# Altium footprint library lib_protel_HC_BOINA.PCBLIB: 726 footprints (part 27 of 46)
Each footprint in its own frame and in the unit in brackets; x right, y up, seen from the top. Pads: shape width x height; smd on the part's side, far side on the other; paste and mask are expansions set on the pad; w line width, h text height; cw(c..) or ccw(c..) is an arc to the next point about the centre after c.
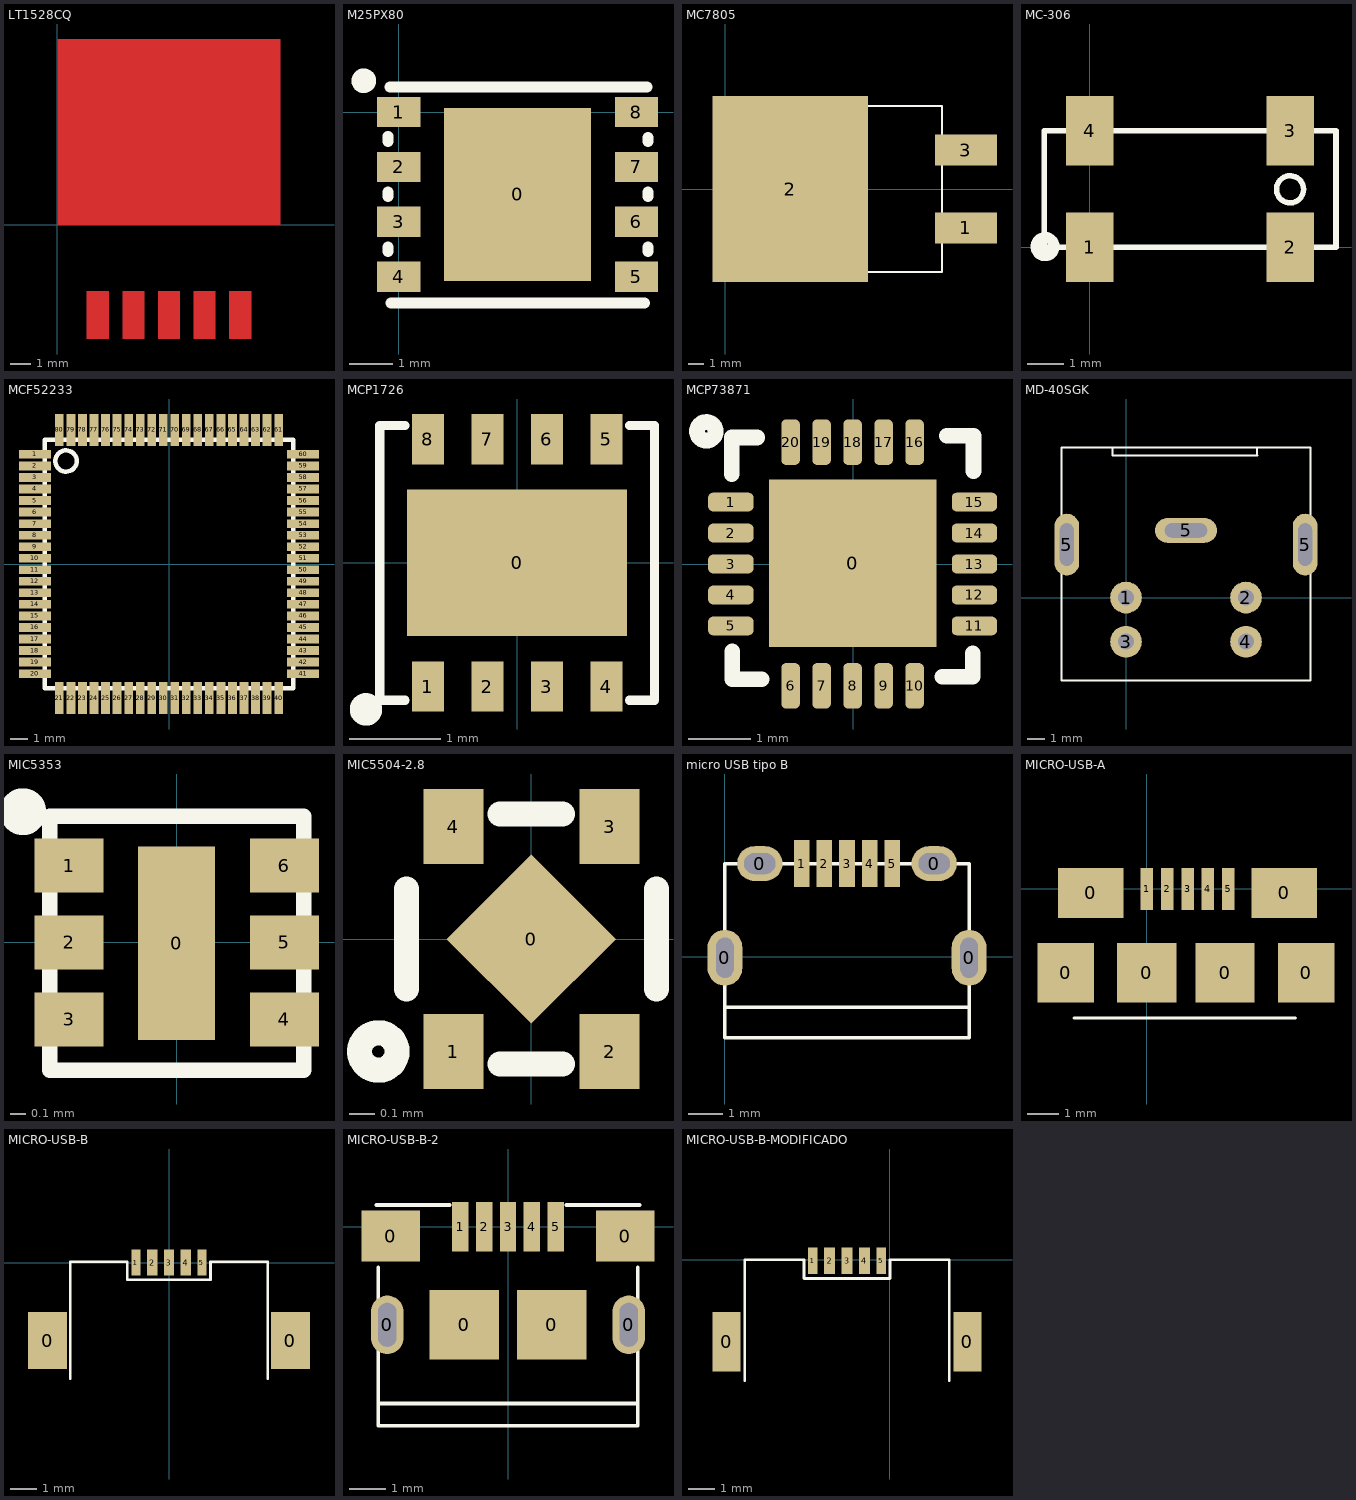
[diagram p26: the footprints below, top view; thin cyan lines are the x and y axes]

## LT1528CQ [mm] "LT1528CQ"
height 4.5
Top Layer:
  rectangle: 0,0 10.668,8.89
  rectangle: 4.801,-5.461 5.867,-3.175
  rectangle: 6.502,-5.461 7.569,-3.175
  rectangle: 3.099,-5.461 4.166,-3.175
  rectangle: 1.397,-5.461 2.464,-3.175
  rectangle: 8.204,-5.461 9.271,-3.175

## M25PX80 [mm] "Memoria Flash"
height 0.65
pads (9):
  rect 3.4x4 smd: 0(2.75,-1.905)
  rect 1x0.7 smd: 1(0,0) 2(0,-1.27) 3(0,-2.54) 4(0,-3.81) 5(5.5,-3.81) 6(5.5,-2.54) 7(5.5,-1.27) 8(5.5,0)
Top Overlay:
  circle w0.3: c-0.81,0.725 r0.135
  lines w0.254: -0.254,-3.226 -0.254,-3.124 ; -0.254,-1.956 -0.254,-1.854 ; -0.254,-0.686 -0.254,-0.559 ; -0.203,0.584 5.74,0.584 ; -0.178,-4.42 5.69,-4.42 ; 5.766,-3.226 5.766,-3.124 ; 5.766,-1.956 5.766,-1.854 ; 5.766,-0.686 5.766,-0.584
3D body "User Library-WSON-8.STEP": height 0.79, standoff -0.01, extent -0.248,-4.374 5.752,0.626

## MC7805 [mm] "REGULADOR MC7805"
pads (3):
  rect 4x2 smd: 1(15.5,-2.504) 3(15.5,2.504)
  rect 10x12 smd: 2(4.191,0)
Top Overlay:
  lines w0.127: 0,-5.334 13.97,-5.334 13.97,5.334 0,5.334 0,-5.334

## MC-306 [mm] "CRYSTAL 32.768KHZ"
height 2.54
pads (4):
  rect 1.3x1.9 smd: 1(0,0) 2(5.5,0) 3(5.5,3.2) 4(0,3.2)
Top Overlay:
  circle w0.15: c5.5,1.59 r0.371
  circle w0.3: c-1.22,0.02 r0.25
  lines w0.152: -1.24,0 -1.24,3.2 6.76,3.2 6.76,0 -1.24,0

## MCF52233 [mm]
height 1.6
pads (80):
  rect 1.8x0.49 smd: 1(-7.55,6.175) 2(-7.55,5.525) 3(-7.55,4.875) 4(-7.55,4.225) 5(-7.55,3.575) 6(-7.55,2.925) 7(-7.55,2.275) 8(-7.55,1.625) 9(-7.55,0.975) 10(-7.55,0.325) 11(-7.55,-0.325) 12(-7.55,-0.975) 13(-7.55,-1.625) 14(-7.55,-2.275) 15(-7.55,-2.925) 16(-7.55,-3.575) 17(-7.55,-4.225) 18(-7.55,-4.875) 19(-7.55,-5.525) 20(-7.55,-6.175) 41(7.55,-6.175) 42(7.55,-5.525) 43(7.55,-4.875) 44(7.55,-4.225) 45(7.55,-3.575) 46(7.55,-2.925) 47(7.55,-2.275) 48(7.55,-1.625) 49(7.55,-0.975) 50(7.55,-0.325) 51(7.55,0.325) 52(7.55,0.975) 53(7.55,1.625) 54(7.55,2.275) 55(7.55,2.925) 56(7.55,3.575) 57(7.55,4.225) 58(7.55,4.875) 59(7.55,5.525) 60(7.55,6.175)
  rect 0.49x1.8 smd: 21(-6.175,-7.55) 22(-5.525,-7.55) 23(-4.875,-7.55) 24(-4.225,-7.55) 25(-3.575,-7.55) 26(-2.925,-7.55) 27(-2.275,-7.55) 28(-1.625,-7.55) 29(-0.975,-7.55) 30(-0.325,-7.55) 31(0.325,-7.55) 32(0.975,-7.55) 33(1.625,-7.55) 34(2.275,-7.55) 35(2.925,-7.55) 36(3.575,-7.55) 37(4.225,-7.55) 38(4.875,-7.55) 39(5.525,-7.55) 40(6.175,-7.55) 61(6.175,7.55) 62(5.525,7.55) 63(4.875,7.55) 64(4.225,7.55) 65(3.575,7.55) 66(2.925,7.55) 67(2.275,7.55) 68(1.625,7.55) 69(0.975,7.55) 70(0.325,7.55) 71(-0.325,7.55) 72(-0.975,7.55) 73(-1.625,7.55) 74(-2.275,7.55) 75(-2.925,7.55) 76(-3.575,7.55) 77(-4.225,7.55) 78(-4.875,7.55) 79(-5.525,7.55) 80(-6.175,7.55)
Top Overlay:
  circle w0.254: c-5.8,5.8 r0.6
  lines w0.254: -7,-7 7,-7 7,7 -7,7 -7,-7

## MCP1726 [mm] "REG MCP1726 ADJ"
height 0.9
pads (9):
  rect 2.4x1.6 smd mask+0.05: 0(0,0)
  rect 0.35x0.55 smd mask+0.05: 1(-0.975,-1.35) 2(-0.325,-1.35) 3(0.325,-1.35) 4(0.975,-1.35) 6(0.325,1.35) 7(-0.325,1.35) 8(-0.975,1.35)
  rect 0.35x0.55 smd paste+0 mask+0.05: 5(0.975,1.35)
Top Overlay:
  circle w0.254: c-1.65,-1.6 r0.05
  lines w0.1: -1.225,-1.5 -1.5,-1.5 -1.5,1.5 -1.225,1.5 ; 1.225,-1.5 1.5,-1.5 1.5,1.5 1.225,1.5

## MCP73871 [mm] "Battery charger"
height 0.9
pads (21):
  rect 2.7x2.7 smd paste+0 mask+0: 0(-0.01,0.01)
  rrect50% 0.73x0.3 smd mask+0.05: 1(-1.975,1) 2(-1.975,0.5) 3(-1.975,0) 4(-1.975,-0.5) 5(-1.975,-1) 11(1.955,-1) 12(1.955,-0.5) 13(1.955,0) 14(1.955,0.5) 15(1.955,1)
  rrect50% 0.3x0.73 smd mask+0.05: 6(-1.01,-1.965) 7(-0.51,-1.965) 8(-0.01,-1.965) 9(0.49,-1.965) 10(0.99,-1.965) 16(0.99,1.965) 17(0.49,1.965) 18(-0.01,1.965) 19(-0.51,1.965) 20(-1.01,1.965)
Top Overlay:
  circle w0.254: c-2.37,2.14 r0.15
  lines w0.254: -1.96,1.45 -1.96,2.04 -1.55,2.04 ; -1.95,-1.41 -1.95,-1.86 -1.48,-1.86 ; 1.44,-1.82 1.93,-1.82 1.93,-1.44 ; 1.51,2.07 1.94,2.07 1.94,1.5
3D body "QFN20_4x4x0_8.STEP": height 0.78, standoff -0.02, extent -2.02,-2 2,2.02

## MD-40SGK [mm] "CONECTOR S-VIDEO"
height 13
pads (7):
  round 1.8 hole 0.9: 1(0,0) 2(6.8,0) 3(0,-2.5) 4(6.8,-2.5)
  oval 1.4x3.5 hole 0.8 slot 2.4 at 90 deg: 5(-3.35,3) 5(10.15,3)
  oval 3.5x1.4 hole 0.8 slot 2.4 at 0 deg: 5(3.4,3.8)
Top Overlay:
  lines w0.127: -0.76,8.5 -0.76,8.05 7.44,8.05 7.43,8.06 7.43,8.49 ; -3.65,-4.7 10.45,-4.7 10.45,8.5 -3.65,8.5 -3.65,-4.7

## MIC5353 [mm] "Regulador LDO Vout=3V"
height 0.6
pads (7):
  rect 0.5x1.26 smd mask+0: 0(0,-0.005)
  rect 0.45x0.35 smd mask+0.05: 1(-0.7,0.5) 2(-0.7,0) 3(-0.7,-0.5) 4(0.7,-0.5) 5(0.7,0) 6(0.7,0.5)
Top Overlay:
  circle w0.254: c-1,0.85 r0.025
  lines w0.1: -0.825,-0.83 -0.825,0.82 0.825,0.82 0.825,-0.83 -0.825,-0.83
3D body "User Library-Thin MLF.step": height 0.55, standoff 0, extent -0.81,-0.8 0.81,0.8

## MIC5504-2.8 [mm] "TDFN1010"
height 0.55
pads (5):
  rect 0.48x0.48 smd rot 45 mask+0.05: 0(0,0)
  rect 0.24x0.3 smd mask+0.05: 1(-0.312,-0.45) 2(0.312,-0.45) 3(0.312,0.45) 4(-0.312,0.45)
Top Overlay:
  circle w0.1: c-0.613,-0.45 r0.075
  lines w0.1: -0.5,-0.2 -0.5,0.2 ; -0.125,-0.5 0.125,-0.5 ; -0.125,0.5 0.125,0.5 ; 0.5,-0.2 0.5,0.2
3D body: height 0.55, standoff 0, extent -0.5,-0.5 0.5,0.5

## micro USB tipo B [mm] "USB micro B"
height 3
pads (9):
  oval 1x1.6 hole 0.5 slot 1.15 at 90 deg mask+0.05: 0(0,-0.025) 0(7,-0.025)
  oval 1.3x1 hole 0.6 slot 0.9 at 0 deg mask+0.05: 0(1,2.675) 0(6,2.675)
  rect 0.45x1.35 smd mask+0.05: 1(2.2,2.675) 2(2.85,2.675) 3(3.5,2.675) 4(4.15,2.675) 5(4.8,2.675)
Top Overlay:
  lines w0.1: 0,-1.45 7,-1.45 ; 0,-2.325 0,2.675 7,2.675 7,-2.325 0,-2.325

## MICRO USB-B MODIFICADO [mm] "Conector Micro USB Tipo B Board Cutout modificado Gafas"
height 2.8

## MICRO-USB-A [mm] "USB-MICRO-A"
height 2.8
pads (11):
  rect 1.8x1.9 smd: 0(-2.6,-2.68) 0(5.1,-2.68)
  rect 2.1x1.6 smd: 0(-1.8,-0.125) 0(4.4,-0.125)
  rect 1.9x1.9 smd: 0(0,-2.68) 0(2.5,-2.68)
  rect 0.4x1.35 smd: 1(0,0) 2(0.65,0) 3(1.3,0) 4(1.95,0) 5(2.6,0)
Top Overlay:
  lines w0.1: -2.331,-4.13 4.755,-4.13

## MICRO-USB-B [mm] "USB-MICRO-B"
height 2.8
pads (7):
  rect 1.5x2.2 smd: 0(-4.675,-3) 0(4.675,-3)
  rect 0.349x1 smd: 1(-1.274,0.004) 5(1.27,0.004)
  rect 0.4x1 smd: 2(-0.652,0.004) 3(-0.002,0.004) 4(0.648,0.004)
Top Overlay:
  lines w0.1: -3.802,-4.46 -3.802,0.04 -1.602,0.04 -1.602,-0.66 1.598,-0.66 1.598,0.04 3.798,0.04 3.798,-4.46
3D body "USB3070_DS.stp": height 1.59, standoff -1.19, extent -4.652,-5.528 4.648,0.408

## MICRO-USB-B-2 [mm] "USB micro B"
height 3.1
pads (11):
  oval 0.9x1.6 hole 0.5 slot 1.2 at 90 deg mask+0.05: 0(-3.3,-2.675) 0(3.3,-2.675)
  rect 1.6x1.4 smd: 0(-3.2,-0.25) 0(3.2,-0.25)
  rect 1.9x1.9 smd: 0(-1.2,-2.676) 0(1.2,-2.676)
  rect 0.45x1.35 smd mask+0.05: 1(-1.3,0) 2(-0.65,0) 3(0,0) 4(0.65,0) 5(1.3,0)
Top Overlay:
  lines w0.1: -3.6,0.6 -1.6,0.6 ; -3.55,-4.825 3.55,-4.825 ; -3.55,-1.1 -3.55,-5.435 3.55,-5.435 3.55,-1.1 ; 1.6,0.6 3.6,0.6
3D body "User Library-10118194.step": height 2.68, standoff -0.6, extent -4.025,-5.435 4.025,0.145

## MICRO-USB-B-MODIFICADO [mm] "USB-MICRO-B"
height 2.8
pads (7):
  rect 1.036x2.2 smd: 0(-6.082,-3.05) 0(2.882,-3.05)
  rect 0.349x1 smd: 1(-2.872,-0.036) 5(-0.328,-0.036)
  rect 0.4x1 smd: 2(-2.25,-0.036) 3(-1.6,-0.036) 4(-0.95,-0.036)
Top Overlay:
  lines w0.1: -5.4,-4.5 -5.4,0 -3.2,0 -3.2,-0.7 0,-0.7 0,0 2.2,0 2.2,-4.5
3D body "USB3070_DS.stp": height 1.59, standoff -1.19, extent -6.25,-5.568 3.05,0.368